# Altium footprint library DrPCB.PcbLib: 910 footprints (part 8 of 57)
Each footprint in its own frame and in the unit in brackets; x right, y up, seen from the top. Pads: shape width x height; smd on the part's side, far side on the other; paste and mask are expansions set on the pad; w line width, h text height; cw(c..) or ccw(c..) is an arc to the next point about the centre after c.
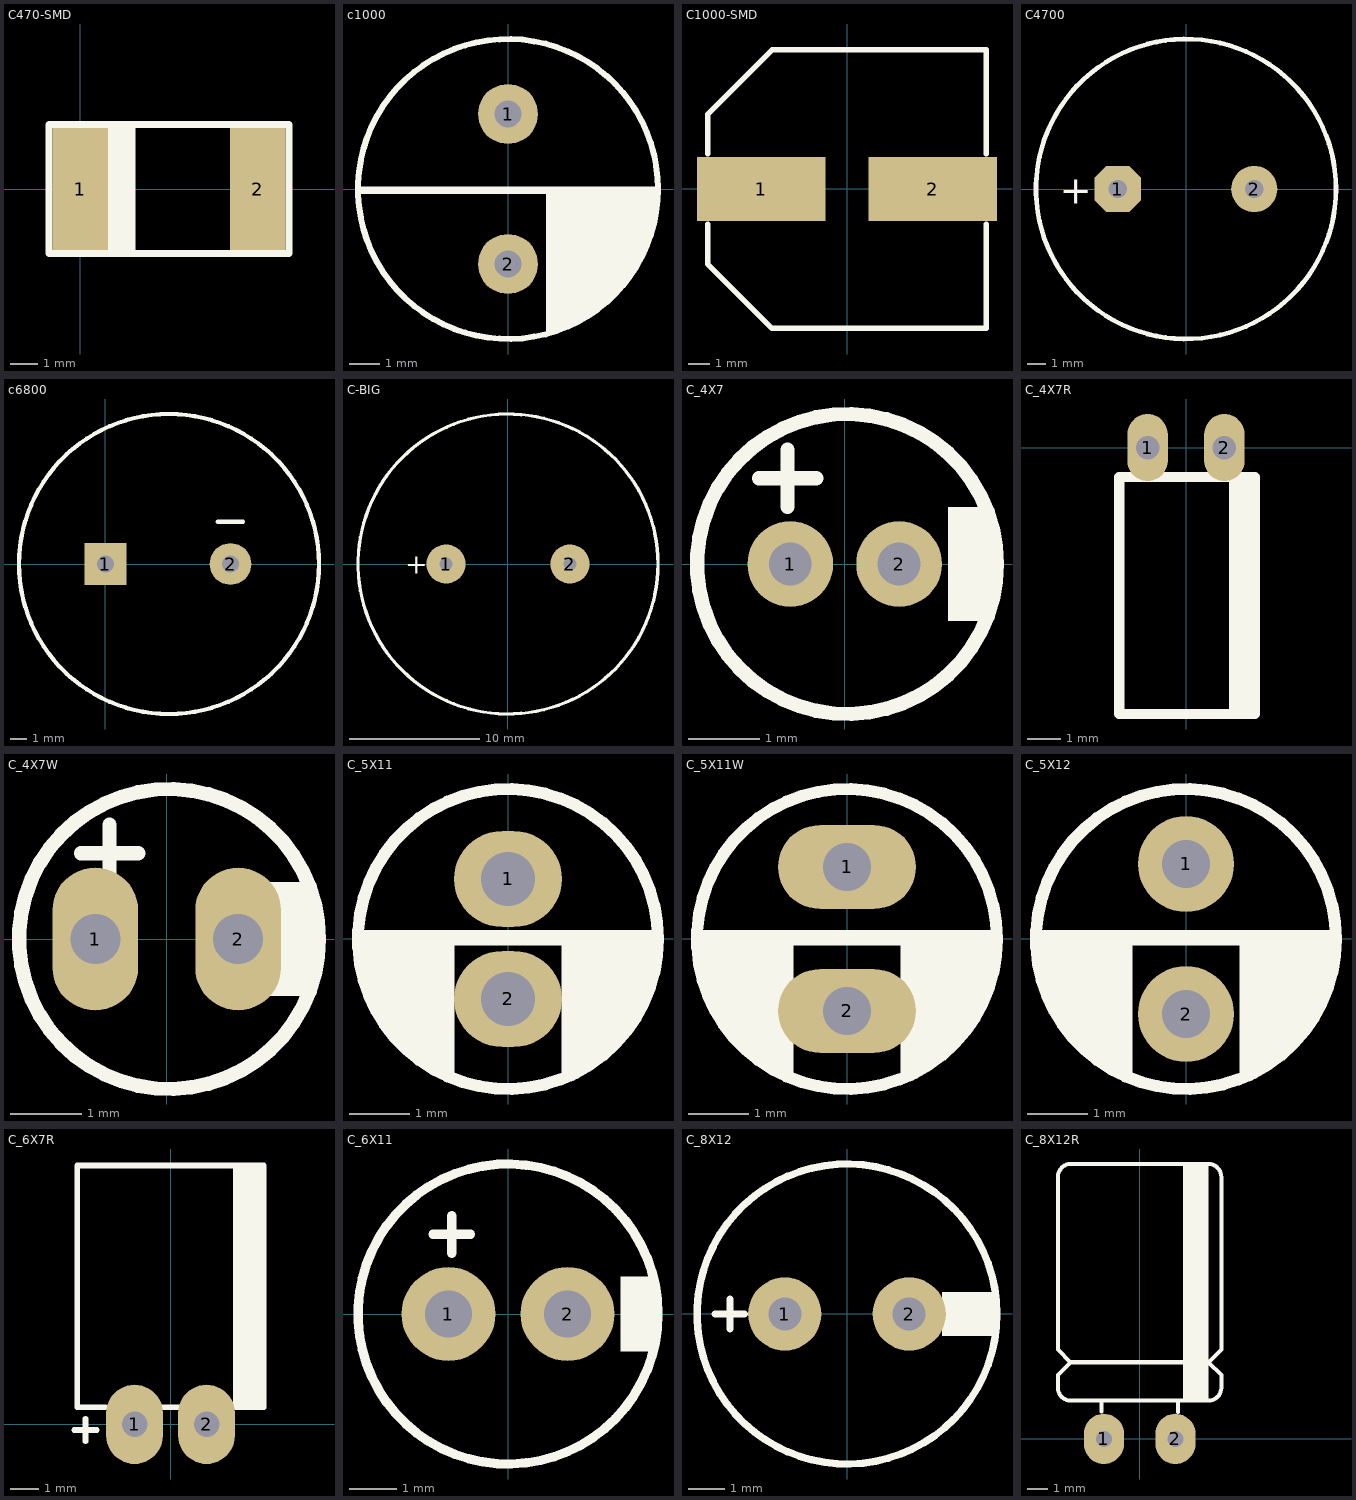
[diagram p7: the footprints below, top view; thin cyan lines are the x and y axes]

## C470-SMD [mm]
pads (2):
  rect 2x4.4 smd: 1(0,0) 2(6.4,0)
Top Overlay:
  lines w0.254: 1.118,-2.311 1.118,2.311 ; 1.13,2.324 1.143,2.311 ; 1.359,2.261 1.384,2.235 ; 1.372,-2.299 1.372,2.235 ; 1.613,2.261 1.626,2.248 1.626,-2.299 ; 1.841,2.299 1.867,2.273 1.867,-2.286 ; -1.118,-2.324 -1.118,2.324 7.518,2.324 7.518,-2.324 -1.118,-2.324
3D body "User Library-AVX_E_CASE.step": height 4.21, standoff 0.01, extent -0.5,-2.225 6.901,2.225

## c1000 [mm]
pads (2):
  round 2 hole 0.9: 1(0,2.5) 2(0,-2.5)
Top Overlay:
  circle w0.2: c0,0 r5
  lines w0.254: -4.953,-0.04 4.953,-0.04 ; 1.397,-4.739 1.397,-0.04 ; 1.524,-4.358 2.159,-4.358 2.005,-4.512 1.624,-4.512 1.524,-4.612 1.524,-0.04 ; 1.524,-4.231 2.54,-4.231 ; 1.524,-4.104 2.794,-4.104 ; 1.524,-3.977 2.921,-3.977 ; 1.524,-3.723 3.175,-3.723 3.048,-3.85 1.651,-3.85 ; 1.524,-3.596 3.302,-3.596 ; 1.524,-3.469 3.429,-3.469 3.683,-3.215 ; 1.524,-3.215 3.683,-3.215 ; 1.524,-2.961 3.683,-2.961 4.064,-2.58 ; 1.524,-2.707 3.937,-2.707 4.162,-2.482 ; 1.524,-2.58 4.064,-2.58 ; 1.524,-2.326 4.318,-2.326 4.064,-2.58 ; 1.524,-2.199 4.445,-2.199 ; 1.524,-1.945 4.572,-1.945 ; 1.524,-1.818 4.445,-1.818 ; 1.524,-1.691 4.572,-1.691 ; 1.524,-1.564 4.572,-1.564 ; 1.524,-1.437 4.699,-1.437 ; 1.524,-1.183 4.826,-1.183 ; 1.524,-0.929 4.826,-0.929 ; 1.524,-0.675 4.826,-0.675 ; 1.524,-0.294 4.953,-0.294 ; 2.159,-0.04 2.413,-0.04 ; 3.683,-3.215 4.064,-2.834 4.064,-2.58
  lines w0.265: 1.397,-0.421 4.826,-0.421
3D body "CircuitWorks-ELECTROLITIC CAPACITOR RADIAL 10X12.step": height 12.01, standoff -2.49, extent -5,-5 5,5

## C1000-SMD [mm]
pads (2):
  rect 6x3 smd: 1(-4,-0.005) 2(4,-0.005)
Top Overlay:
  lines w0.254: -6.502,-3.5 -6.502,-1.638 ; -6.502,-3.492 -3.492,-6.502 6.49,-6.502 6.49,-1.651 ; -6.502,1.638 -6.502,3.5 ; -6.477,3.505 -3.482,6.5 6.5,6.5 6.5,1.649

## C4700 [mm]
pads (2):
  oct 2.5x2.5 hole 1: 1(-3.7,0)
  round 2.5 hole 1: 2(3.7,0)
Top Overlay:
  circle w0.254: c0,0 r8.125
  text "+" at -6.845,-0.787 h1.52
3D body "User Library-CAPAER_D160_L400_P075_W008X030.STEP": height 40.01, standoff -3, extent -8.005,-8 8.005,8

## c6800 [mm]
pads (2):
  rect 2.5x2.5 hole 1: 1(0,0)
  round 2.5 hole 1: 2(7.5,0)
Top Overlay:
  circle w0.254: c3.81,0 r9
  lines w0.254: 6.731,2.54 8.255,2.54

## C-BIG [mm]
pads (2):
  round 3 hole 1: 1(-4.75,0) 2(4.75,0)
Top Overlay:
  circle w0.254: c0,0 r11.5
  text "+" at -7.861,-0.75 h1.5

## C_4X7 [mm] "Cap Elec, D4.0X7.0H pitch: 1.5mm"
height 7
pads (2):
  round 1.2 hole 0.6: 1(-0.762,0) 2(0.762,0)
Top Overlay:
  circle w0.2: c0.032,0 r2.1
  rectangle: 1.446,-0.8 2.046,0.8
  lines w0.2: -1.2,1.2 -0.4,1.2 ; -0.8,0.8 -0.8,1.6
3D body "User Library-Cap electrolitic radial 4x7.STEP": height 1, standoff -7.5, extent -1.999,-1.997 1.999,2

## C_4X7R [mm] "Cap Elec, D4.0X7.0H pitch: 1.5mm"
height 7
pads (2):
  oval 1.2x2 hole 0.7: 1(-1.143,0) 2(1.143,0)
Top Overlay:
  rectangle: 1.283,-7.874 2.051,-0.876
  lines w0.3: -1.987,-7.931 -1.987,-0.876 2.051,-0.876 2.051,-7.931 -1.962,-7.931
3D body "User Library-C4x7_1_5.step": height 4.1, standoff -1.9, extent -1.968,-7.948 2.032,0.302

## C_4X7W [mm] "Cap Elec, D4.0X7.0H pitch: 1.5mm"
height 7
pads (2):
  oval 1.2x2 hole 0.7: 1(-1,0) 2(1,0)
Top Overlay:
  circle w0.2: c0.032,0 r2.1
  rectangle: 1.446,-0.8 2.046,0.8
  lines w0.2: -1.2,1.2 -0.4,1.2 ; -0.8,0.8 -0.8,1.6
3D body "User Library-Cap electrolitic radial 4x7.STEP": height 1, standoff -7.5, extent -1.999,-1.997 1.999,2

## C_5X11 [mm]
pads (2):
  oval 1.8x1.6 hole 0.9: 1(0,1) 2(0,-1)
Top Overlay:
  circle w0.2: c0,0 r2.5
  lines w0.254: -2.159,-0.996 -2.159,0.02 ; -2.159,-0.742 -2.375,-0.526 -2.375,0.02 2.413,0.02 ; -2.007,-1.402 -2.007,-0.005 ; -1.778,-1.631 -1.778,-1.123 -1.778,0.02 ; -1.651,-1.758 -1.651,-1.631 -1.651,0.02 ; -1.524,0.02 -1.524,-1.885 -1.397,-2.012 -1.397,-0.107 -1.27,0.02 -1.27,-2.012 -1.143,-2.139 -1.143,-0.107 -1.016,0.02 -1.016,-2.235 ; 1.016,0.02 1.016,-2.222 1.038,-2.244 1.143,-2.139 ; 1.143,-1.885 1.397,-1.885 ; 1.143,-2.139 1.397,-1.885 ; 1.143,-2.139 1.143,-1.631 ; 1.143,-2.139 1.143,-0.107 2.286,-0.107 2.413,-0.234 1.27,-0.234 1.143,-0.361 2.286,-0.361 2.286,-0.742 ; 1.143,-1.631 1.397,-1.885 ; 1.143,-1.631 1.651,-1.631 ; 1.397,-1.885 1.651,-1.631 ; 1.651,-1.631 1.86,-1.422 1.188,-1.422 1.016,-1.25 2.083,-1.25 2.159,-1.174 2.159,-1.123 2.039,-1.003 1.136,-1.003 1.27,-0.869 2.159,-0.869 2.286,-0.742 ; 2.286,-0.742 1.27,-0.742 1.143,-0.869 1.143,-0.572 2.115,-0.572 2.286,-0.742
3D body "User Library-CE_R100_D200_H460.step": height 12.01, standoff -3.09, extent -2.538,-2.54 2.538,2.54

## C_5X11W [mm]
pads (2):
  oval 2.3x1.4 hole 0.8: 1(0,1.2) 2(0,-1.2)
Top Overlay:
  circle w0.2: c0,0 r2.5
  lines w0.254: -2.159,-0.996 -2.159,0.02 ; -2.159,-0.742 -2.375,-0.526 -2.375,0.02 2.413,0.02 ; -2.007,-1.402 -2.007,-0.005 ; -1.778,-1.631 -1.778,-1.123 -1.778,0.02 ; -1.651,-1.758 -1.651,-1.631 -1.651,0.02 ; -1.524,0.02 -1.524,-1.885 -1.397,-2.012 -1.397,-0.107 -1.27,0.02 -1.27,-2.012 -1.143,-2.139 -1.143,-0.107 -1.016,0.02 -1.016,-2.235 ; 1.016,0.02 1.016,-2.222 1.038,-2.244 1.143,-2.139 ; 1.143,-1.885 1.397,-1.885 ; 1.143,-2.139 1.397,-1.885 ; 1.143,-2.139 1.143,-1.631 ; 1.143,-2.139 1.143,-0.107 2.286,-0.107 2.413,-0.234 1.27,-0.234 1.143,-0.361 2.286,-0.361 2.286,-0.742 ; 1.143,-1.631 1.397,-1.885 ; 1.143,-1.631 1.651,-1.631 ; 1.397,-1.885 1.651,-1.631 ; 1.651,-1.631 1.86,-1.422 1.188,-1.422 1.016,-1.25 2.083,-1.25 2.159,-1.174 2.159,-1.123 2.039,-1.003 1.136,-1.003 1.27,-0.869 2.159,-0.869 2.286,-0.742 ; 2.286,-0.742 1.27,-0.742 1.143,-0.869 1.143,-0.572 2.115,-0.572 2.286,-0.742
3D body "User Library-CE_R100_D200_H460.step": height 12.01, standoff -3.09, extent -2.538,-2.54 2.538,2.54

## C_5X12 [mm]
pads (2):
  round 1.6 hole 0.8: 1(0,1.25) 2(0,-1.25)
Top Overlay:
  circle w0.2: c0,0 r2.5
  lines w0.254: -2.159,-0.996 -2.159,0.02 ; -2.159,-0.742 -2.375,-0.526 -2.375,0.02 2.413,0.02 ; -2.007,-1.402 -2.007,-0.005 ; -1.778,-1.631 -1.778,-1.123 -1.778,0.02 ; -1.651,-1.758 -1.651,-1.631 -1.651,0.02 ; -1.524,0.02 -1.524,-1.885 -1.397,-2.012 -1.397,-0.107 -1.27,0.02 -1.27,-2.012 -1.143,-2.139 -1.143,-0.107 -1.016,0.02 -1.016,-2.235 ; 1.016,0.02 1.016,-2.222 1.038,-2.244 1.143,-2.139 ; 1.143,-1.885 1.397,-1.885 ; 1.143,-2.139 1.397,-1.885 ; 1.143,-2.139 1.143,-1.631 ; 1.143,-2.139 1.143,-0.107 2.286,-0.107 2.413,-0.234 1.27,-0.234 1.143,-0.361 2.286,-0.361 2.286,-0.742 ; 1.143,-1.631 1.397,-1.885 ; 1.143,-1.631 1.651,-1.631 ; 1.397,-1.885 1.651,-1.631 ; 1.651,-1.631 1.86,-1.422 1.188,-1.422 1.016,-1.25 2.083,-1.25 2.159,-1.174 2.159,-1.123 2.039,-1.003 1.136,-1.003 1.27,-0.869 2.159,-0.869 2.286,-0.742 ; 2.286,-0.742 1.27,-0.742 1.143,-0.869 1.143,-0.572 2.115,-0.572 2.286,-0.742
3D body "User Library-CE_R100_D200_H460.step": height 12.01, standoff -3.09, extent -2.538,-2.54 2.538,2.54

## C_6X7R [mm] "Cap Elec, D6.3X12.0H pitch: 2.5mm"
height 11
pads (2):
  oval 2x2.8 hole 0.9: 1(-1.27,0) 2(1.27,0)
Top Overlay:
  rectangle: 2.21,0.635 3.21,9.182
  lines w0.2: -3.4,-0.2 -2.6,-0.2 ; -3,-0.6 -3,0.2 ; -2.3,0.6 -3.289,0.6 -3.289,9.131 3.289,9.131 3.289,0.6 2.3,0.6 ; -0.3,0.6 0.3,0.6
3D body "User Library-Cap electro 6_3x7x2_5mm RA.step": height 6.68, standoff -2.5, extent -3.176,-0.317 3.175,9.004

## C_6X11 [mm] "Cap Elec, D6.3X11.0H pitch: 2.5mm"
height 11
pads (2):
  round 2 hole 1: 1(-1.27,0) 2(1.27,0)
Top Overlay:
  circle w0.2: c0,0 r3.2
  rectangle: 2.4,-0.8 3.184,0.8
  lines w0.2: -1.6,1.7 -0.8,1.7 ; -1.2,1.3 -1.2,2.1
3D body "SW3dPS-Cap electro 6.3x11x2.5mm.STEP": height 2.51, standoff -12.03, extent -3.168,-3.175 3.175,3.176

## C_8X12 [mm] "Cap Elec, D8.0X12.0H pitch: 3.5mm, RB.14/.26, RB.15/.32"
height 12
pads (2):
  round 2 hole 0.9: 1(-1.7,0) 2(1.7,0)
Top Overlay:
  circle w0.2: c0,0 r4.1
  rectangle: 2.6,-0.6 4,0.6
  lines w0.2: -3.6,0 -2.8,0 ; -3.2,-0.4 -3.2,0.4
3D body "User Library-Cap electro 8x11_5x3_5mm.step": height 2.98, standoff -12.53, extent -4.017,-4.025 4.025,4.025

## C_8X12R [mm] "Cap Elec, D8.0X12.0H pitch: 3.5mm, RIGHT ANGLE"
pads (2):
  oval 2x2.5 hole 0.8: 1(-1.778,0) 2(1.778,0)
Top Overlay:
  region: 2.159,13.67 2.159,1.905 3.429,1.905 3.429,13.67
  lines w0.2: -1.905,1.359 -1.905,1.905 ; 1.905,1.346 1.905,1.905 ; -3.429,3.81 -4.064,4.445 -4.064,13.035 cw(c-3.429,13.035) -3.429,13.67 3.429,13.67 cw(c3.429,13.035) 4.064,13.035 4.064,4.445 3.429,3.81 ; -3.429,3.81 -4.064,3.175 -4.064,2.54 ccw(c-3.429,2.54) -3.429,1.905 3.429,1.905 ccw(c3.429,2.54) 4.064,2.54 4.064,3.175 3.429,3.81 ; -3.429,3.81 3.429,3.81
3D body "User Library-Cap electro 8x11_5x3_5mm RA.step": height 8.03, standoff -2, extent -4.025,-0.3 4.025,13.521